# Altium schematic symbol library Minh_Lib.SchLib: 619 symbols (part 4 of 4) (continued)
## STM32F103C8T6_1 (continued)
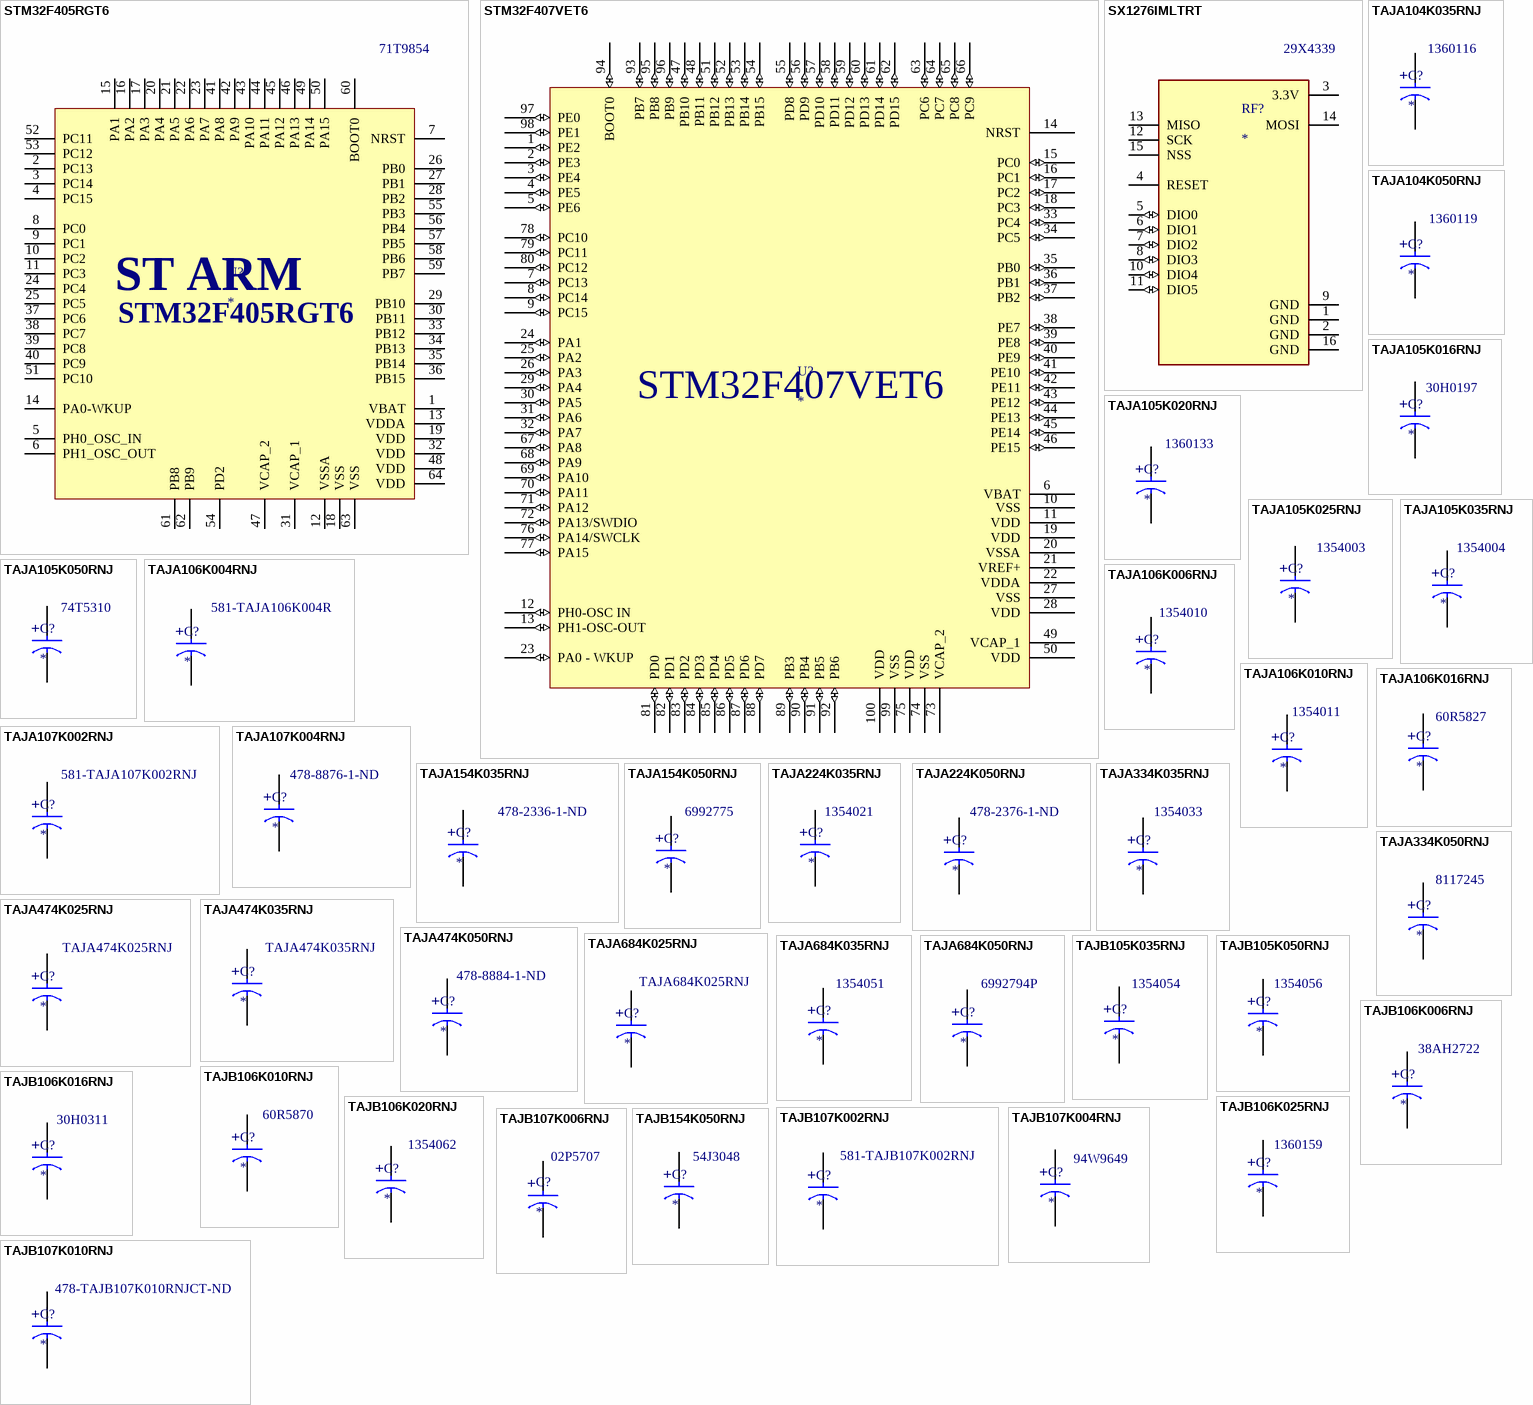
[diagram p14: symbols STM32F405RGT6 to TAJB154K050RNJ]

## STM32F405RGT6
designator U?  Supplier Part Number 1: 71T9854
IC MCU 32BIT 1MB FLASH 64LQFP; Manufacturer: STMicroelectronics; Manufacturer Part Number: STM32F405RGT6; Core Architecture: ARM; Interface: I2C,SPI,USB,CAN,IrDA,UART,USART,LIN,I2S; Data Bus Width: 32b; Frequency: 168MHz; RAM Size: 196KB; Number of I/Os: 51; Max Supply Voltage: 3.6V; Min Supply Voltage: 1.8V; Memory Size: 1024KB; Number of Timers/Counters: 14; Number of ADC Channels: 16; Oscillator Type: Internal; Number of SPI Channels: 3; Peripherals: Brown-out Detect/Reset,POR,PWM,WDT,DMA,LCD,I2C; Number of PWM Channels: 2; Watchdog Timer: Yes; Supplier 1: Newark; RoHS: Yes; Category: Microcontrollers; Pricing 1: 1=16.96000, 10=15.60000, 25=14.94000, 50=14.35000, 100=13.76000, 250=13.17000, 500=11.78000 (USD); Case/Package: LQFP; Number of Pins: 64; Min Operating Temperature: -40°C; Max Operating Temperature: 85°C; Package Quantity: 960; Packaging: Tray; Max Frequency: 168MHz; Number of I2C Channels: 3; Memory Type: FLASH; Number of UART Channels: 2; Series: STM32 F4; Number of Programmable I/O: 51; Length: 10mm; Width: 10mm; Height: 1.45mm; Radiation Hardening: No; Reach SVHC Compliant: Yes; RoHS Compliant: Yes; Lead Free: Lead Free; ComponentLink1URL: https://datasheet.ciiva.com/8055/1717982-8055024.pdf?src-supplier=Element14; ComponentLink1Description: https://datasheet.ciiva.com/8055/1717982-8055024.pdf?src-supplier=Element14; ComponentLink2URL: https://datasheet.ciiva.com/4837/dm00037051-492832-4837997.pdf?src-supplier=Mouser; ComponentLink2Description: https://datasheet.ciiva.com/4837/dm00037051-492832-4837997.pdf?src-supplier=Mouser
footprint LQFP64
pins: 1 VBAT, 2 PC13, 3 PC14, 4 PC15, 5 PH0_OSC_IN, 6 PH1_OSC_OUT, 7 NRST, 8 PC0, 9 PC1, 10 PC2, 11 PC3, 12 VSSA, 13 VDDA, 14 PA0-WKUP, 15 PA1, 16 PA2, 17 PA3, 18 VSS, 19 VDD, 20 PA4, 21 PA5, 22 PA6, 23 PA7, 24 PC4, 25 PC5, 26 PB0, 27 PB1, 28 PB2, 29 PB10, 30 PB11, 31 VCAP_1, 32 VDD, 33 PB12, 34 PB13, 35 PB14, 36 PB15, 37 PC6, 38 PC7, 39 PC8, 40 PC9, 41 PA8, 42 PA9, 43 PA10, 44 PA11, 45 PA12, 46 PA13, 47 VCAP_2, 48 VDD, 49 PA14, 50 PA15, 51 PC10, 52 PC11, 53 PC12, 54 PD2, 55 PB3, 56 PB4, 57 PB5, 58 PB6, 59 PB7, 60 BOOT0, 61 PB8, 62 PB9, 63 VSS, 64 VDD
text: ST ARM

## STM32F407VET6
designator U?
IC MCU 32BIT 512KB FLASH 100LQFP; Manufacturer: STMicroelectronics; Manufacturer Part Number: STM32F407VET6; Frequency: 168MHz; Number of I/Os: 82; Interface: I2C,SPI,USB,CAN,Ethernet,IrDA,UART,USART,LIN,EBI/EMI,I2S; Oscillator Type: Internal; Peripherals: Brown-out Detect/Reset,POR,PWM,WDT,DMA,LCD,I2C; Core Architecture: ARM; RAM Size: 196KB; Number of ADC Channels: 16; Number of Ethernet Channels: 1; Number of Timers/Counters: 14; Number of UART Channels: 2; Max Supply Voltage: 3.6V; Min Supply Voltage: 1.8V; Data Bus Width: 32b; Number of SPI Channels: 3; Watchdog Timer: Yes; Supplier 1: Avnet; RoHS: Yes; Category: Microcontrollers; Pricing 1: 90=9.01321, 100=8.83112, 190=8.64904, 450=8.46695, 900=8.28487, 4500=8.10278, 9000=7.92070 (USD); Case/Package: LQFP; Number of Pins: 100; Min Operating Temperature: -40°C; Max Operating Temperature: 85°C; Packaging: Tray; Memory Type: FLASH; Memory Size: 512KB; Package Quantity: 90; Number of Programmable I/O: 82; Max Frequency: 168MHz; Number of I2C Channels: 3; Series: STM32 F4; Number of PWM Channels: 2; Length: 14.2mm; Width: 14.2mm; Height: 1.45mm; Radiation Hardening: No; RoHS Compliant: Yes; Reach SVHC Compliant: Yes; Lead Free: Lead Free; ComponentLink1URL: https://datasheet.ciiva.com/16330/dm00037051-16330920.pdf?src-supplier=Future+Electronics; ComponentLink1Description: https://datasheet.ciiva.com/16330/dm00037051-16330920.pdf?src-supplier=Future+Electronics; ComponentLink2URL: https://datasheet.ciiva.com/8055/1717982-8055038.pdf?src-supplier=Element14; ComponentLink2Description: https://datasheet.ciiva.com/8055/1717982-8055038.pdf?src-supplier=Element14; ComponentLink3URL: https://datasheet.ciiva.com/4837/dm00037051-492832-4837637.pdf?src-supplier=Mouser; ComponentLink3Description: https://datasheet.ciiva.com/4837/dm00037051-492832-4837637.pdf?src-supplier=Mouser; Supplier Part Number 1: STM32F407VET6
footprint LQFP100
pins: 1 PE2 (io), 2 PE3 (io), 3 PE4 (io), 4 PE5 (io), 5 PE6 (io), 6 VBAT (power), 7 PC13 (io), 8 PC14 (io), 9 PC15 (io), 10 VSS (power), 11 VDD (power), 12 PH0-OSC IN (io), 13 PH1-OSC-OUT (io), 14 NRST, 15 PC0 (io), 16 PC1 (io), 17 PC2 (io), 18 PC3 (io), 19 VDD (power), 20 VSSA (power), 21 VREF+ (power), 22 VDDA (power), 23 PA0 - WKUP (io), 24 PA1 (io), 25 PA2 (io), 26 PA3 (io), 27 VSS (power), 28 VDD (power), 29 PA4 (io), 30 PA5 (io), 31 PA6 (io), 32 PA7 (io), 33 PC4 (io), 34 PC5 (io), 35 PB0 (io), 36 PB1 (io), 37 PB2 (io), 38 PE7 (io), 39 PE8 (io), 40 PE9 (io), 41 PE10 (io), 42 PE11 (io), 43 PE12 (io), 44 PE13 (io), 45 PE14 (io), 46 PE15 (io), 47 PB10 (io), 48 PB11 (io), 49 VCAP_1 (power), 50 VDD (power), 51 PB12 (io), 52 PB13 (io), 53 PB14 (io), 54 PB15 (io), 55 PD8 (io), 56 PD9 (io), 57 PD10 (io), 58 PD11 (io), 59 PD12 (io), 60 PD13 (io), 61 PD14 (io), 62 PD15 (io), 63 PC6 (io), 64 PC7 (io), 65 PC8 (io), 66 PC9 (io), 67 PA8 (io), 68 PA9 (io), 69 PA10 (io), 70 PA11 (io), 71 PA12 (io), 72 PA13/SWDIO (io), 73 VCAP_2 (power), 74 VSS (power), 75 VDD (power), 76 PA14/SWCLK (io), 77 PA15 (io), 78 PC10 (io), 79 PC11 (io), 80 PC12 (io), 81 PD0 (io), 82 PD1 (io), 83 PD2 (io), 84 PD3 (io), 85 PD4 (io), 86 PD5 (io), 87 PD6 (io), 88 PD7 (io), 89 PB3 (io), 90 PB4 (io), 91 PB5 (io), 92 PB6 (io), 93 PB7 (io), 94 BOOT0 (io), 95 PB8 (io), 96 PB9 (io), 97 PE0 (io), 98 PE1 (io), 99 VSS (power), 100 VDD (power)

## SX1276IMLTRT
designator RF?  Supplier Part Number 1: 29X4339
Rf Ism Transceiver Fsk/gfsk/gmsk/msk/ook 3.3V Automotive 28-PIN QFN Ep T/r; Manufacturer: Semtech; Manufacturer Part Number: SX1276IMLTRT; Frequency: 137MHz; Data Rate: 300Kbps; Sensitivity: -148dBm; Number of GPIO: 6; Interface: SPI; Current - Receiving: 12mA; Current - Transmitting: 120mA; Operating Supply Voltage: 3.7V; Supplier 1: Newark; RoHS: Yes; Category: RF Receivers, Transceivers; Stock 1: 2848; Pricing 1: 1=9.90000, 10=9.04000, 25=8.28000, 50=7.88000, 100=7.47000, 250=6.87000, 500=6.24000 (USD); Case/Package: VQFN; Min Operating Temperature: -40°C; Max Operating Temperature: 85°C; Packaging: Tape and Reel; Package Quantity: 3000; Lead Free: Lead Free; RoHS Compliant: Yes; ComponentLink1URL: https://datasheet.ciiva.com/29635/sx1276-29635606.pdf?src-supplier=Digi-Key; ComponentLink1Description: https://datasheet.ciiva.com/29635/sx1276-29635606.pdf?src-supplier=Digi-Key; ComponentLink2URL: https://datasheet.ciiva.com/29635/sx1276-29635607.pdf?src-supplier=Digi-Key; ComponentLink2Description: https://datasheet.ciiva.com/29635/sx1276-29635607.pdf?src-supplier=Digi-Key; ComponentLink3URL: https://datasheet.ciiva.com/29635/sx1276-29635605.pdf?src-supplier=Digi-Key; ComponentLink3Description: https://datasheet.ciiva.com/29635/sx1276-29635605.pdf?src-supplier=Digi-Key
footprint Lora SX1278 433MHz  / Ai-Thinker Ra-02 (415MHZ)
pins: 1 GND (power), 2 GND (power), 3 3.3V (power), 4 RESET, 5 DIO0 (io), 6 DIO1 (io), 7 DIO2 (io), 8 DIO3 (io), 9 GND, 10 DIO4 (io), 11 DIO5 (io), 12 SCK, 13 MISO, 14 MOSI, 15 NSS, 16 GND (power)

## TAJA104K035RNJ
designator C?  Supplier Part Number 1: 1360116
钽电容 0.1uF ±10% 35V 24Ω A型3216; Manufacturer: Kyocera AVX; Manufacturer Part Number: TAJA104K035RNJ; Dielectric Material: Tantalum; Capacitance: 100nF; ESR (Equivalent Series Resistance): 24R; Leakage Current: 500nA; Polarity: Polar; Dissipation Factor: 4%; Q Factor: 4; Supplier 1: RSComponents; RoHS: Yes; Category: Tantalum Capacitors; Stock 1: 1; Pricing 1: 50=0.40200, 250=0.26900, 1000=0.16100, 2500=0.13400 (USD); Mount: Surface Mount,PCB; Case/Package: 1206; Number of Pins: 2; Case Code (Imperial): 1206; Case Code (Metric): 3216; Min Operating Temperature: -55°C; Max Operating Temperature: 125°C; Tolerance: 10%; Voltage Rating: 35V; Voltage Rating (DC): 35V; Package Quantity: 1; Packaging: Tape and Reel; Termination: SMD/SMT; Voltage: 35V; Features: General Purpose; Series: TAJ; Construction: Flat; Length: 3.2mm; Width: 1.6mm; Height: 1.6mm; Height - Seated (Max): 0.071inch; Depth: 1.6mm; Lead Pitch: 1.1mm; Radiation Hardening: No; RoHS Compliant: Yes; REACH SVHC: No SVHC; Lead Free: Lead Free; ComponentLink1URL: https://datasheet.ciiva.com/26929/getdatasheetpartid-71413-26929277.pdf?src-supplier=Verical; ComponentLink1Description: https://datasheet.ciiva.com/26929/getdatasheetpartid-71413-26929277.pdf?src-supplier=Verical; ComponentLink2URL: https://datasheet.ciiva.com/18710/taj-eng-18710620.pdf?src-supplier=Distrelec; ComponentLink2Description: https://datasheet.ciiva.com/18710/taj-eng-18710620.pdf?src-supplier=Distrelec; ComponentLink3URL: https://datasheet.ciiva.com/263/taj-263924.pdf?src-supplier=Digi-Key; ComponentLink3Description: https://datasheet.ciiva.com/263/taj-263924.pdf?src-supplier=Digi-Key; ComponentLink4URL: https://datasheet.ciiva.com/263/taj-263923.pdf?src-supplier=Digi-Key; ComponentLink4Description: https://datasheet.ciiva.com/263/taj-263923.pdf?src-supplier=Digi-Key; ComponentLink5URL: https://datasheet.ciiva.com/263/taj-263925.pdf?src-supplier=Digi-Key; ComponentLink5Description: https://datasheet.ciiva.com/263/taj-263925.pdf?src-supplier=Digi-Key; ComponentLink6URL: https://datasheet.ciiva.com/14590/70001050-14590597.pdf?src-supplier=Allied+Electronics; ComponentLink6Description: https://datasheet.ciiva.com/14590/70001050-14590597.pdf?src-supplier=Allied+Electronics; ComponentLink7URL: https://datasheet.ciiva.com/14593/70001050-14593609.pdf?src-supplier=Allied+Electronics; ComponentLink7Description: https://datasheet.ciiva.com/14593/70001050-14593609.pdf?src-supplier=Allied+Electronics; ComponentLink8URL: https://datasheet.ciiva.com/11216/taj-11216814.pdf?src-supplier=Avnet; ComponentLink8Description: https://datasheet.ciiva.com/11216/taj-11216814.pdf?src-supplier=Avnet; ComponentLink9URL: https://datasheet.ciiva.com/16297/taj-16297467.pdf?src-supplier=Future+Electronics; ComponentLink9Description: https://datasheet.ciiva.com/16297/taj-16297467.pdf?src-supplier=Future+Electronics; ComponentLink10URL: https://datasheet.ciiva.com/16486/taj-16486069.pdf?src-supplier=Avnet+Asia; ComponentLink10Description: https://datasheet.ciiva.com/16486/taj-16486069.pdf?src-supplier=Avnet+Asia; ComponentLink11URL: https://datasheet.ciiva.com/3004/taj-3004370.pdf?src-supplier=Avnet; ComponentLink11Description: https://datasheet.ciiva.com/3004/taj-3004370.pdf?src-supplier=Avnet
footprint Capacitor/Tantalum  - SMD3216/A - AVX (1206/3216-18 SIZE A-AVX)
pins: 1, 2
text: +

## TAJA104K050RNJ
designator C?  Supplier Part Number 1: 1360119
钽电容 0.1uF ±10% 50V 22Ω A型3216; Manufacturer: Kyocera AVX; Manufacturer Part Number: TAJA104K050RNJ; Dielectric Material: Tantalum; Capacitance: 100nF; ESR (Equivalent Series Resistance): 22R; Leakage Current: 500nA; Polarity: Polar; Dissipation Factor: 4%; Supplier 1: RSComponents; RoHS: Yes; Category: Tantalum Capacitors; Stock 1: 1; Pricing 1: 20=0.55300, 60=0.46900, 100=0.41400, 260=0.35900, 1000=0.33200 (USD); Mount: Surface Mount,PCB; Case/Package: 1206; Number of Pins: 2; Case Code (Metric): 3216; Case Code (Imperial): 1206; Weight: 0.000571oz; Min Operating Temperature: -55°C; Max Operating Temperature: 125°C; Tolerance: 10%; Package Quantity: 1; Voltage Rating: 50V; Packaging: Tape and Reel; Voltage Rating (DC): 50V; Termination: SMD/SMT; Voltage: 50V; Features: General Purpose; Series: TAJ; Construction: Flat; Length: 3.2mm; Width: 1.6mm; Height: 1.6mm; Height - Seated (Max): 0.071inch; Depth: 1.6mm; Lead Pitch: 1.1mm; Radiation Hardening: No; REACH SVHC: No SVHC; Lead Free: Lead Free; RoHS Compliant: Yes; ComponentLink1URL: https://datasheet.ciiva.com/7853/1680476-7853077.pdf?src-supplier=Element14; ComponentLink1Description: https://datasheet.ciiva.com/7853/1680476-7853077.pdf?src-supplier=Element14; ComponentLink2URL: https://datasheet.ciiva.com/263/taj-263730.pdf?src-supplier=Digi-Key; ComponentLink2Description: https://datasheet.ciiva.com/263/taj-263730.pdf?src-supplier=Digi-Key; ComponentLink3URL: https://datasheet.ciiva.com/263/taj-263729.pdf?src-supplier=Digi-Key; ComponentLink3Description: https://datasheet.ciiva.com/263/taj-263729.pdf?src-supplier=Digi-Key; ComponentLink4URL: https://datasheet.ciiva.com/263/taj-263731.pdf?src-supplier=Digi-Key; ComponentLink4Description: https://datasheet.ciiva.com/263/taj-263731.pdf?src-supplier=Digi-Key; ComponentLink5URL: https://datasheet.ciiva.com/12910/taj-27497-12910895.pdf?src-supplier=Mouser; ComponentLink5Description: https://datasheet.ciiva.com/12910/taj-27497-12910895.pdf?src-supplier=Mouser; ComponentLink6URL: https://datasheet.ciiva.com/14592/70001050-14592121.pdf?src-supplier=Allied+Electronics; ComponentLink6Description: https://datasheet.ciiva.com/14592/70001050-14592121.pdf?src-supplier=Allied+Electronics; ComponentLink7URL: https://datasheet.ciiva.com/14595/70001050-14595389.pdf?src-supplier=Allied+Electronics; ComponentLink7Description: https://datasheet.ciiva.com/14595/70001050-14595389.pdf?src-supplier=Allied+Electronics; ComponentLink8URL: https://datasheet.ciiva.com/11216/taj-11216839.pdf?src-supplier=Avnet; ComponentLink8Description: https://datasheet.ciiva.com/11216/taj-11216839.pdf?src-supplier=Avnet; ComponentLink9URL: https://datasheet.ciiva.com/16289/taj-16289723.pdf?src-supplier=Future+Electronics; ComponentLink9Description: https://datasheet.ciiva.com/16289/taj-16289723.pdf?src-supplier=Future+Electronics; ComponentLink10URL: https://datasheet.ciiva.com/15163/getdatasheetpartid-62923-15163130.pdf?src-supplier=Verical; ComponentLink10Description: https://datasheet.ciiva.com/15163/getdatasheetpartid-62923-15163130.pdf?src-supplier=Verical
footprint Capacitor/Tantalum  - SMD3216/A - AVX (1206/3216-18 SIZE A-AVX)
pins: 1, 2
text: +

## TAJA105K016RNJ
designator C?  Supplier Part Number 1: 30H0197
钽电容 1uF ±10% 16V 11Ω A型3216; Manufacturer: Kyocera AVX; Manufacturer Part Number: TAJA105K016RNJ; Dielectric Material: Tantalum; Tolerance: 20%; ESR (Equivalent Series Resistance): 11R; Polarity: Polar; Leakage Current: 500nA; Dissipation Factor: 4%; Supplier 1: Newark; RoHS: Yes; Category: Tantalum Capacitors; Mount: Surface Mount,PCB; Case/Package: 1206; Number of Pins: 2; Case Code (Metric): 3216; Case Code (Imperial): 1206; Weight: 0.000571oz; Min Operating Temperature: -55°C; Max Operating Temperature: 125°C; Capacitance: 1uF; Voltage Rating (DC): 16V; Packaging: Tape and Reel; Package Quantity: 1; Voltage Rating: 16V; Termination: SMD/SMT; Voltage: 16V; Features: General Purpose; Series: TAJ; Length: 3.2mm; Width: 1.6mm; Height: 1.6mm; Height - Seated (Max): 0.071inch; Depth: 1.6mm; Lead Pitch: 1.1mm; Radiation Hardening: No; REACH SVHC: No SVHC; Lead Free: Lead Free; RoHS Compliant: Yes; ComponentLink1URL: https://datasheet.ciiva.com/18710/taj-eng-18710647.pdf?src-supplier=Distrelec; ComponentLink1Description: https://datasheet.ciiva.com/18710/taj-eng-18710647.pdf?src-supplier=Distrelec; ComponentLink2URL: https://datasheet.ciiva.com/7832/taj-7832811.pdf?src-supplier=Element14; ComponentLink2Description: https://datasheet.ciiva.com/7832/taj-7832811.pdf?src-supplier=Element14; ComponentLink3URL: https://datasheet.ciiva.com/7832/taj-7832810.pdf?src-supplier=Element14; ComponentLink3Description: https://datasheet.ciiva.com/7832/taj-7832810.pdf?src-supplier=Element14; ComponentLink4URL: https://datasheet.ciiva.com/7832/1680476-7832431.pdf?src-supplier=Element14; ComponentLink4Description: https://datasheet.ciiva.com/7832/1680476-7832431.pdf?src-supplier=Element14; ComponentLink5URL: https://datasheet.ciiva.com/263/taj-263410.pdf?src-supplier=Digi-Key; ComponentLink5Description: https://datasheet.ciiva.com/263/taj-263410.pdf?src-supplier=Digi-Key; ComponentLink6URL: https://datasheet.ciiva.com/263/taj-263409.pdf?src-supplier=Digi-Key; ComponentLink6Description: https://datasheet.ciiva.com/263/taj-263409.pdf?src-supplier=Digi-Key; ComponentLink7URL: https://datasheet.ciiva.com/263/taj-263411.pdf?src-supplier=Digi-Key; ComponentLink7Description: https://datasheet.ciiva.com/263/taj-263411.pdf?src-supplier=Digi-Key; ComponentLink8URL: https://datasheet.ciiva.com/7832/1703059-7832429.pdf?src-supplier=Element14; ComponentLink8Description: https://datasheet.ciiva.com/7832/1703059-7832429.pdf?src-supplier=Element14; ComponentLink9URL: https://datasheet.ciiva.com/7832/1703059-7832430.pdf?src-supplier=Element14; ComponentLink9Description: https://datasheet.ciiva.com/7832/1703059-7832430.pdf?src-supplier=Element14
footprint Capacitor/Tantalum  - SMD3216/A - AVX (1206/3216-18 SIZE A-AVX)
pins: 1, 2
text: +

## TAJA105K020RNJ
designator C?  Supplier Part Number 1: 1360133
钽电容 1uF ±10% 20V 9Ω A型3216; Manufacturer: Kyocera AVX; Manufacturer Part Number: TAJA105K020RNJ; Dielectric Material: Tantalum; Tolerance: 20%; ESR (Equivalent Series Resistance): 9R; Leakage Current: 500nA; Polarity: Polar; Dissipation Factor: 4%; Supplier 1: RSComponents; RoHS: Yes; Category: Tantalum Capacitors; Stock 1: 1; Pricing 1: 20=0.29000, 100=0.28000, 200=0.26600, 500=0.24200, 1000=0.21500 (USD); Mount: Surface Mount,PCB; Case/Package: 1206; Number of Pins: 2; Case Code (Imperial): 1206; Case Code (Metric): 3216; Min Operating Temperature: -55°C; Max Operating Temperature: 125°C; Capacitance: 1uF; Voltage Rating: 20V; Voltage Rating (DC): 20V; Package Quantity: 1; Packaging: Tape and Reel; Termination: SMD/SMT; Voltage: 20V; Features: General Purpose; Series: TAJ; Construction: Flat; Length: 3.2mm; Width: 1.6mm; Height: 1.6mm; Height - Seated (Max): 0.071inch; Depth: 1.6mm; Radiation Hardening: No; REACH SVHC: No SVHC; Lead Free: Lead Free; RoHS Compliant: Yes; ComponentLink1URL: https://datasheet.ciiva.com/11794/0900766b80ccdc61-11794382.pdf?src-supplier=RSComponents; ComponentLink1Description: https://datasheet.ciiva.com/11794/0900766b80ccdc61-11794382.pdf?src-supplier=RSComponents; ComponentLink2URL: https://datasheet.ciiva.com/12883/taj-27497-12883280.pdf?src-supplier=Mouser; ComponentLink2Description: https://datasheet.ciiva.com/12883/taj-27497-12883280.pdf?src-supplier=Mouser; ComponentLink3URL: https://datasheet.ciiva.com/263/taj-263413.pdf?src-supplier=Digi-Key; ComponentLink3Description: https://datasheet.ciiva.com/263/taj-263413.pdf?src-supplier=Digi-Key; ComponentLink4URL: https://datasheet.ciiva.com/263/taj-263412.pdf?src-supplier=Digi-Key; ComponentLink4Description: https://datasheet.ciiva.com/263/taj-263412.pdf?src-supplier=Digi-Key; ComponentLink5URL: https://datasheet.ciiva.com/263/taj-263414.pdf?src-supplier=Digi-Key; ComponentLink5Description: https://datasheet.ciiva.com/263/taj-263414.pdf?src-supplier=Digi-Key; ComponentLink6URL: https://datasheet.ciiva.com/14608/70001050-14608053.pdf?src-supplier=Allied+Electronics; ComponentLink6Description: https://datasheet.ciiva.com/14608/70001050-14608053.pdf?src-supplier=Allied+Electronics; ComponentLink7URL: https://datasheet.ciiva.com/14598/70001050-14598921.pdf?src-supplier=Allied+Electronics; ComponentLink7Description: https://datasheet.ciiva.com/14598/70001050-14598921.pdf?src-supplier=Allied+Electronics; ComponentLink8URL: https://datasheet.ciiva.com/3004/taj-3004373.pdf?src-supplier=Avnet; ComponentLink8Description: https://datasheet.ciiva.com/3004/taj-3004373.pdf?src-supplier=Avnet; ComponentLink9URL: https://datasheet.ciiva.com/16203/taj-16203563.pdf?src-supplier=Future+Electronics; ComponentLink9Description: https://datasheet.ciiva.com/16203/taj-16203563.pdf?src-supplier=Future+Electronics; ComponentLink10URL: https://datasheet.ciiva.com/16486/taj-16486073.pdf?src-supplier=Avnet+Asia; ComponentLink10Description: https://datasheet.ciiva.com/16486/taj-16486073.pdf?src-supplier=Avnet+Asia; ComponentLink11URL: https://datasheet.ciiva.com/3004/taj-3004372.pdf?src-supplier=Avnet; ComponentLink11Description: https://datasheet.ciiva.com/3004/taj-3004372.pdf?src-supplier=Avnet
footprint Capacitor/Tantalum  - SMD3216/A - AVX (1206/3216-18 SIZE A-AVX)
pins: 1, 2
text: +

## TAJA105K025RNJ
designator C?  Supplier Part Number 1: 1354003
钽电容 1uF ±10% 25V 8Ω A型3216; Manufacturer: Kyocera AVX; Manufacturer Part Number: TAJA105K025RNJ; Dielectric Material: Tantalum; Tolerance: 20%; ESR (Equivalent Series Resistance): 8R; Leakage Current: 500nA; Dissipation Factor: 4%; Polarity: Polar; Dielectric: X7R; Supplier 1: RSComponents; RoHS: Yes; Category: Tantalum Capacitors; Stock 1: 9030; Pricing 1: 2000=0.13300, 6000=0.12000 (USD); Mount: Surface Mount,PCB; Case/Package: 1206; Number of Pins: 2; Case Code (Metric): 3216; Case Code (Imperial): 1206; Weight: 0.000571oz; Min Operating Temperature: -55°C; Max Operating Temperature: 125°C; Capacitance: 1uF; Package Quantity: 1; Voltage Rating: 25V; Packaging: Tape and Reel; Voltage Rating (DC): 25V; Termination: SMD/SMT; Voltage: 25V; Features: General Purpose; Series: TAJ; Construction: Flat; Length: 3.2mm; Width: 1.6mm; Height: 1.6mm; Height - Seated (Max): 0.071inch; Depth: 1.6mm; Radiation Hardening: No; REACH SVHC: No SVHC; Lead Free: Lead Free; RoHS Compliant: Yes; ComponentLink1URL: https://datasheet.ciiva.com/11793/0900766b80ccdc61-11793068.pdf?src-supplier=RSComponents; ComponentLink1Description: https://datasheet.ciiva.com/11793/0900766b80ccdc61-11793068.pdf?src-supplier=RSComponents; ComponentLink2URL: https://datasheet.ciiva.com/26341/559407-da-01-en-tacc-a-3-2-mm-x-1-6-mm-x-1-6-mm-1-0-uf-26341752.pdf?src-supplier=Conrad; ComponentLink2Description: https://datasheet.ciiva.com/26341/559407-da-01-en-tacc-a-3-2-mm-x-1-6-mm-x-1-6-mm-1-0-uf-26341752.pdf?src-supplier=Conrad; ComponentLink3URL: https://datasheet.ciiva.com/7832/1680476-7832437.pdf?src-supplier=Element14; ComponentLink3Description: https://datasheet.ciiva.com/7832/1680476-7832437.pdf?src-supplier=Element14; ComponentLink4URL: https://datasheet.ciiva.com/263/taj-263440.pdf?src-supplier=Digi-Key; ComponentLink4Description: https://datasheet.ciiva.com/263/taj-263440.pdf?src-supplier=Digi-Key; ComponentLink5URL: https://datasheet.ciiva.com/263/taj-263439.pdf?src-supplier=Digi-Key; ComponentLink5Description: https://datasheet.ciiva.com/263/taj-263439.pdf?src-supplier=Digi-Key; ComponentLink6URL: https://datasheet.ciiva.com/263/taj-263441.pdf?src-supplier=Digi-Key; ComponentLink6Description: https://datasheet.ciiva.com/263/taj-263441.pdf?src-supplier=Digi-Key; ComponentLink7URL: https://datasheet.ciiva.com/12911/taj-27497-12911454.pdf?src-supplier=Mouser; ComponentLink7Description: https://datasheet.ciiva.com/12911/taj-27497-12911454.pdf?src-supplier=Mouser; ComponentLink8URL: https://datasheet.ciiva.com/3004/taj-3004374.pdf?src-supplier=Avnet; ComponentLink8Description: https://datasheet.ciiva.com/3004/taj-3004374.pdf?src-supplier=Avnet; ComponentLink9URL: https://datasheet.ciiva.com/16380/taj-16380127.pdf?src-supplier=Future+Electronics; ComponentLink9Description: https://datasheet.ciiva.com/16380/taj-16380127.pdf?src-supplier=Future+Electronics; ComponentLink10URL: https://datasheet.ciiva.com/15163/getdatasheetpartid-91077-15163275.pdf?src-supplier=Verical; ComponentLink10Description: https://datasheet.ciiva.com/15163/getdatasheetpartid-91077-15163275.pdf?src-supplier=Verical; ComponentLink11URL: https://datasheet.ciiva.com/3004/taj-3004375.pdf?src-supplier=Avnet; ComponentLink11Description: https://datasheet.ciiva.com/3004/taj-3004375.pdf?src-supplier=Avnet
footprint Capacitor/Tantalum  - SMD3216/A - AVX (1206/3216-18 SIZE A-AVX)
pins: 1, 2
text: +

## TAJA105K035RNJ
designator C?  Supplier Part Number 1: 1354004
钽电容 1uF ±10% 35V 7.5Ω A型3216; Manufacturer: Kyocera AVX; Manufacturer Part Number: TAJA105K035RNJ; Dielectric Material: Tantalum; Tolerance: 20%; ESR (Equivalent Series Resistance): 7.5R; Leakage Current: 500nA; Polarity: Polar; Dissipation Factor: 4%; Voltage: 25V; Q Factor: 4; Supplier 1: RSComponents; RoHS: Yes; Category: Tantalum Capacitors; Stock 1: 2000; Pricing 1: 2000=0.13200, 4000=0.12600, 6000=0.12100 (USD); Mount: Surface Mount,PCB; Case/Package: 1206; Number of Pins: 2; Case Code (Imperial): 1206; Case Code (Metric): 3216; Weight: 0.000571oz; Min Operating Temperature: -55°C; Max Operating Temperature: 125°C; Capacitance: 1uF; Package Quantity: 1; Voltage Rating: 35V; Packaging: Tape and Reel; Voltage Rating (DC): 35V; Termination: SMD/SMT; Features: General Purpose; Series: TAJ; Construction: Flat; Length: 3.2mm; Width: 1.6mm; Height: 1.6mm; Height - Seated (Max): 0.071inch; Depth: 1.6mm; Radiation Hardening: No; REACH SVHC: No SVHC; Lead Free: Lead Free; RoHS Compliant: Yes; ComponentLink1URL: https://datasheet.ciiva.com/11794/0900766b802e69d0-11794381.pdf?src-supplier=RSComponents; ComponentLink1Description: https://datasheet.ciiva.com/11794/0900766b802e69d0-11794381.pdf?src-supplier=RSComponents; ComponentLink2URL: https://datasheet.ciiva.com/26341/559408-da-01-en-tacc-a-3-2-mm-x-1-6-mm-x-1-6-mm-1-0-uf-26341750.pdf?src-supplier=Conrad; ComponentLink2Description: https://datasheet.ciiva.com/26341/559408-da-01-en-tacc-a-3-2-mm-x-1-6-mm-x-1-6-mm-1-0-uf-26341750.pdf?src-supplier=Conrad; ComponentLink3URL: https://datasheet.ciiva.com/15163/getdatasheetpartid-110557-15163365.pdf?src-supplier=Verical; ComponentLink3Description: https://datasheet.ciiva.com/15163/getdatasheetpartid-110557-15163365.pdf?src-supplier=Verical; ComponentLink4URL: https://datasheet.ciiva.com/16338/taj-16338780.pdf?src-supplier=Future+Electronics; ComponentLink4Description: https://datasheet.ciiva.com/16338/taj-16338780.pdf?src-supplier=Future+Electronics; ComponentLink5URL: https://datasheet.ciiva.com/3004/taj-3004376.pdf?src-supplier=Avnet; ComponentLink5Description: https://datasheet.ciiva.com/3004/taj-3004376.pdf?src-supplier=Avnet; ComponentLink6URL: https://datasheet.ciiva.com/14605/70001050-14605278.pdf?src-supplier=Allied+Electronics; ComponentLink6Description: https://datasheet.ciiva.com/14605/70001050-14605278.pdf?src-supplier=Allied+Electronics; ComponentLink7URL: https://datasheet.ciiva.com/14603/70001050-14603833.pdf?src-supplier=Allied+Electronics; ComponentLink7Description: https://datasheet.ciiva.com/14603/70001050-14603833.pdf?src-supplier=Allied+Electronics; ComponentLink8URL: https://datasheet.ciiva.com/12911/taj-27497-12911077.pdf?src-supplier=Mouser; ComponentLink8Description: https://datasheet.ciiva.com/12911/taj-27497-12911077.pdf?src-supplier=Mouser; ComponentLink9URL: https://datasheet.ciiva.com/18710/taj-eng-18710621.pdf?src-supplier=Distrelec; ComponentLink9Description: https://datasheet.ciiva.com/18710/taj-eng-18710621.pdf?src-supplier=Distrelec; ComponentLink10URL: https://datasheet.ciiva.com/263/taj-263480.pdf?src-supplier=Digi-Key; ComponentLink10Description: https://datasheet.ciiva.com/263/taj-263480.pdf?src-supplier=Digi-Key; ComponentLink11URL: https://datasheet.ciiva.com/263/taj-263478.pdf?src-supplier=Digi-Key; ComponentLink11Description: https://datasheet.ciiva.com/263/taj-263478.pdf?src-supplier=Digi-Key; ComponentLink12URL: https://datasheet.ciiva.com/263/taj-263479.pdf?src-supplier=Digi-Key; ComponentLink12Description: https://datasheet.ciiva.com/263/taj-263479.pdf?src-supplier=Digi-Key; ComponentLink13URL: https://datasheet.ciiva.com/7832/1680476-7832438.pdf?src-supplier=Element14; ComponentLink13Description: https://datasheet.ciiva.com/7832/1680476-7832438.pdf?src-supplier=Element14; ComponentLink14URL: https://datasheet.ciiva.com/7832/49917-7832439.pdf?src-supplier=Element14; ComponentLink14Description: https://datasheet.ciiva.com/7832/49917-7832439.pdf?src-supplier=Element14; ComponentLink15URL: https://datasheet.ciiva.com/7832/49917-7832440.pdf?src-supplier=Element14; ComponentLink15Description: https://datasheet.ciiva.com/7832/49917-7832440.pdf?src-supplier=Element14; ComponentLink16URL: https://datasheet.ciiva.com/16486/taj-16486078.pdf?src-supplier=Avnet+Asia; ComponentLink16Description: https://datasheet.ciiva.com/16486/taj-16486078.pdf?src-supplier=Avnet+Asia; ComponentLink17URL: https://datasheet.ciiva.com/3004/taj-3004377.pdf?src-supplier=Avnet; ComponentLink17Description: https://datasheet.ciiva.com/3004/taj-3004377.pdf?src-supplier=Avnet
footprint Capacitor/Tantalum  - SMD3216/A - AVX (1206/3216-18 SIZE A-AVX)
pins: 1, 2
text: +

## TAJA105K050RNJ
designator C?  Supplier Part Number 1: 74T5310
钽电容 1uF ±10% 50V 6.6Ω A型3216; Manufacturer: Kyocera AVX; Manufacturer Part Number: TAJA105K050RNJ; ESR (Equivalent Series Resistance): 6.6R; Polarity: Polar; Dissipation Factor: 4%; Supplier 1: Newark; RoHS: Yes; Category: Tantalum Capacitors; Pricing 1: 1=0.54800, 2000=0.54700, 4000=0.54500 (USD); Mount: Surface Mount; Case/Package: 1206; Case Code (Metric): 3216; Case Code (Imperial): 1206; Min Operating Temperature: -55°C; Max Operating Temperature: 125°C; Capacitance: 1uF; Tolerance: 10%; Package Quantity: 2000; Voltage Rating: 50V; Packaging: Tape and Reel; Termination: SMD/SMT; Voltage Rating (DC): 50V; Features: General Purpose; Series: TAJ; Construction: Flat; Length: 3.2mm; Width: 0.063inch; Height: 1.8mm; Height - Seated (Max): 0.071inch; Depth: 1.6mm; Radiation Hardening: No; Lead Free: Lead Free; RoHS Compliant: Yes; ComponentLink1URL: https://datasheet.ciiva.com/11219/taj-11219599.pdf?src-supplier=Avnet; ComponentLink1Description: https://datasheet.ciiva.com/11219/taj-11219599.pdf?src-supplier=Avnet; ComponentLink2URL: https://datasheet.ciiva.com/17337/taj-17337532.pdf?src-supplier=Avnet+Europe; ComponentLink2Description: https://datasheet.ciiva.com/17337/taj-17337532.pdf?src-supplier=Avnet+Europe
footprint Capacitor/Tantalum  - SMD3216/A - AVX (1206/3216-18 SIZE A-AVX)
pins: 1, 2
text: +

## TAJA106K004RNJ
designator C?  Supplier Part Number 1: 581-TAJA106K004R
Cap Tant Solid 10uF 4V A CASE 10% (3.2 X 1.6 X 1.6mm) SMD 3216-18 6 Ohm 125°C T/R; Manufacturer: Kyocera AVX; Manufacturer Part Number: TAJA106K004RNJ; Dielectric Material: Tantalum; ESR (Equivalent Series Resistance): 6R; Polarity: Polar; Dissipation Factor: 6%; Supplier 1: Mouser; RoHS: Yes; Category: Tantalum Capacitors; Stock 1: 1607; Pricing 1: 1=0.85000, 10=0.64300, 50=0.64300, 100=0.46000, 1000=0.30700, 10000=0.25100 (USD); Case/Package: Molded; Number of Pins: 2; Case Code (Imperial): 1206; Case Code (Metric): 3216; Min Operating Temperature: -55°C; Max Operating Temperature: 125°C; Capacitance: 10uF; Tolerance: 10%; Packaging: Tape and Reel; Package Quantity: 2000; Voltage Rating: 4V; Termination: SMD/SMT; Voltage Rating (DC): 4V; Series: TAJ; Construction: Flat; Length: 3.2mm; Width: 1.6mm; Height: 1.8mm; Depth: 1.6mm; Radiation Hardening: No; Lead Free: Lead Free; RoHS Compliant: Yes; ComponentLink1URL: http://components.arrow.com/part/dataview/0323_01307636?src-supplier=Arrow+Europe; ComponentLink1Description: http://components.arrow.com/part/dataview/0323_01307636?src-supplier=Arrow+Europe; ComponentLink2URL: http://www.mouser.com/ds/2/40/taj-776811.pdf?src-supplier=Mouser; ComponentLink2Description: http://www.mouser.com/ds/2/40/taj-776811.pdf?src-supplier=Mouser
footprint Capacitor/Tantalum  - SMD3216/A - AVX (1206/3216-18 SIZE A-AVX)
pins: 1, 2
text: +

## TAJA106K006RNJ
designator C?  Supplier Part Number 1: 1354010
钽电容 10uF ±10% 6.3V 4Ω A型3216; Manufacturer: Kyocera AVX; Manufacturer Part Number: TAJA106K006RNJ; Dielectric Material: Tantalum; Tolerance: 20%; ESR (Equivalent Series Resistance): 4R; Leakage Current: 600nA; Polarity: Polar; Dissipation Factor: 6%; Q Factor: 6; Supplier 1: RSComponents; RoHS: Yes; Category: Tantalum Capacitors; Stock 1: 44000; Pricing 1: 2000=0.11200, 4000=0.10600, 6000=0.10200 (USD); Mount: Surface Mount,PCB; Case/Package: 1206; Case Code (Imperial): 1206; Case Code (Metric): 3216; Min Operating Temperature: -55°C; Max Operating Temperature: 125°C; Capacitance: 10uF; Packaging: Tape and Reel; Voltage Rating: 6.3V; Voltage Rating (DC): 6.3V; Package Quantity: 1; Termination: SMD/SMT; Voltage: 6.3V; Features: General Purpose; Series: TAJ; Construction: Flat; Length: 3.2mm; Width: 1.6mm; Height: 1.6mm; Height - Seated (Max): 0.071inch; Depth: 1.6mm; Radiation Hardening: No; REACH SVHC: No SVHC; Lead Free: Lead Free; RoHS Compliant: Yes; ComponentLink1URL: https://datasheet.ciiva.com/11793/0900766b80ccdc61-11793223.pdf?src-supplier=RSComponents; ComponentLink1Description: https://datasheet.ciiva.com/11793/0900766b80ccdc61-11793223.pdf?src-supplier=RSComponents; ComponentLink2URL: https://datasheet.ciiva.com/263/taj-263371.pdf?src-supplier=Digi-Key; ComponentLink2Description: https://datasheet.ciiva.com/263/taj-263371.pdf?src-supplier=Digi-Key; ComponentLink3URL: https://datasheet.ciiva.com/263/taj-263370.pdf?src-supplier=Digi-Key; ComponentLink3Description: https://datasheet.ciiva.com/263/taj-263370.pdf?src-supplier=Digi-Key; ComponentLink4URL: https://datasheet.ciiva.com/263/taj-263372.pdf?src-supplier=Digi-Key; ComponentLink4Description: https://datasheet.ciiva.com/263/taj-263372.pdf?src-supplier=Digi-Key; ComponentLink5URL: https://datasheet.ciiva.com/12882/taj-27497-12882838.pdf?src-supplier=Mouser; ComponentLink5Description: https://datasheet.ciiva.com/12882/taj-27497-12882838.pdf?src-supplier=Mouser; ComponentLink6URL: https://datasheet.ciiva.com/14590/70001050-14590668.pdf?src-supplier=Allied+Electronics; ComponentLink6Description: https://datasheet.ciiva.com/14590/70001050-14590668.pdf?src-supplier=Allied+Electronics; ComponentLink7URL: https://datasheet.ciiva.com/3004/taj-3004383.pdf?src-supplier=Avnet; ComponentLink7Description: https://datasheet.ciiva.com/3004/taj-3004383.pdf?src-supplier=Avnet; ComponentLink8URL: https://datasheet.ciiva.com/16201/taj-16201592.pdf?src-supplier=Future+Electronics; ComponentLink8Description: https://datasheet.ciiva.com/16201/taj-16201592.pdf?src-supplier=Future+Electronics; ComponentLink9URL: https://datasheet.ciiva.com/16486/taj-16486089.pdf?src-supplier=Avnet+Asia; ComponentLink9Description: https://datasheet.ciiva.com/16486/taj-16486089.pdf?src-supplier=Avnet+Asia; ComponentLink10URL: https://datasheet.ciiva.com/3004/taj-3004384.pdf?src-supplier=Avnet; ComponentLink10Description: https://datasheet.ciiva.com/3004/taj-3004384.pdf?src-supplier=Avnet
footprint Capacitor/Tantalum  - SMD3216/A - AVX (1206/3216-18 SIZE A-AVX)
pins: 1, 2
text: +

## TAJA106K010RNJ
designator C?  Supplier Part Number 1: 1354011
钽电容 10uF ±10% 10V 3Ω A型3216; Manufacturer: Kyocera AVX; Manufacturer Part Number: TAJA106K010RNJ; Dielectric Material: Tantalum; ESR (Equivalent Series Resistance): 3R; Leakage Current: 1uA; Polarity: Polar; Dissipation Factor: 6%; Q Factor: 6; Supplier 1: RSComponents; RoHS: Yes; Category: Tantalum Capacitors; Stock 1: 22000; Pricing 1: 2000=0.18200, 4000=0.17500, 6000=0.16700 (USD); Mount: Surface Mount,PCB; Case/Package: 1206; Number of Pins: 2; Case Code (Metric): 3216; Case Code (Imperial): 1206; Min Operating Temperature: -55°C; Max Operating Temperature: 125°C; Capacitance: 10uF; Tolerance: 10%; Voltage Rating (DC): 10V; Packaging: Tape and Reel; Voltage Rating: 10V; Package Quantity: 1; Termination: SMD/SMT; Voltage: 10V; Features: General Purpose; Series: TAJ; Construction: Flat; Length: 3.2mm; Width: 1.6mm; Height: 1.6mm; Height - Seated (Max): 0.071inch; Depth: 1.6mm; Radiation Hardening: No; Lead Free: Lead Free; RoHS Compliant: Yes; REACH SVHC: No SVHC; ComponentLink1URL: https://datasheet.ciiva.com/11793/0900766b80ccdc61-11793042.pdf?src-supplier=RSComponents; ComponentLink1Description: https://datasheet.ciiva.com/11793/0900766b80ccdc61-11793042.pdf?src-supplier=RSComponents; ComponentLink2URL: https://datasheet.ciiva.com/26341/559409-da-01-en-tacc-a-3-2-mm-x-1-6-mm-x-1-6-mm-10-uf-26341749.pdf?src-supplier=Conrad; ComponentLink2Description: https://datasheet.ciiva.com/26341/559409-da-01-en-tacc-a-3-2-mm-x-1-6-mm-x-1-6-mm-10-uf-26341749.pdf?src-supplier=Conrad; ComponentLink3URL: https://datasheet.ciiva.com/26787/taja106k010rnj-26787085.pdf?src-supplier=IIIC; ComponentLink3Description: https://datasheet.ciiva.com/26787/taja106k010rnj-26787085.pdf?src-supplier=IIIC; ComponentLink4URL: https://datasheet.ciiva.com/18710/taj-eng-18710645.pdf?src-supplier=Distrelec; ComponentLink4Description: https://datasheet.ciiva.com/18710/taj-eng-18710645.pdf?src-supplier=Distrelec; ComponentLink5URL: https://datasheet.ciiva.com/7730/1703059-7730710.pdf?src-supplier=Element14; ComponentLink5Description: https://datasheet.ciiva.com/7730/1703059-7730710.pdf?src-supplier=Element14; ComponentLink6URL: https://datasheet.ciiva.com/7730/1826076-7730711.pdf?src-supplier=Element14; ComponentLink6Description: https://datasheet.ciiva.com/7730/1826076-7730711.pdf?src-supplier=Element14; ComponentLink7URL: https://datasheet.ciiva.com/5936/2613-5936824.pdf?src-supplier=Farnell; ComponentLink7Description: https://datasheet.ciiva.com/5936/2613-5936824.pdf?src-supplier=Farnell; ComponentLink8URL: https://datasheet.ciiva.com/7730/1826076-7730709.pdf?src-supplier=Element14; ComponentLink8Description: https://datasheet.ciiva.com/7730/1826076-7730709.pdf?src-supplier=Element14; ComponentLink9URL: https://datasheet.ciiva.com/263/taj-263395.pdf?src-supplier=Digi-Key; ComponentLink9Description: https://datasheet.ciiva.com/263/taj-263395.pdf?src-supplier=Digi-Key; ComponentLink10URL: https://datasheet.ciiva.com/263/taj-263394.pdf?src-supplier=Digi-Key; ComponentLink10Description: https://datasheet.ciiva.com/263/taj-263394.pdf?src-supplier=Digi-Key; ComponentLink11URL: https://datasheet.ciiva.com/263/taj-263396.pdf?src-supplier=Digi-Key; ComponentLink11Description: https://datasheet.ciiva.com/263/taj-263396.pdf?src-supplier=Digi-Key; ComponentLink12URL: https://datasheet.ciiva.com/12882/taj-27497-12882583.pdf?src-supplier=Mouser; ComponentLink12Description: https://datasheet.ciiva.com/12882/taj-27497-12882583.pdf?src-supplier=Mouser; ComponentLink13URL: https://datasheet.ciiva.com/14593/70001050-14593951.pdf?src-supplier=Allied+Electronics; ComponentLink13Description: https://datasheet.ciiva.com/14593/70001050-14593951.pdf?src-supplier=Allied+Electronics; ComponentLink14URL: https://datasheet.ciiva.com/3004/taj-3004385.pdf?src-supplier=Avnet; ComponentLink14Description: https://datasheet.ciiva.com/3004/taj-3004385.pdf?src-supplier=Avnet; ComponentLink15URL: https://datasheet.ciiva.com/16486/taj-16486093.pdf?src-supplier=Avnet+Asia; ComponentLink15Description: https://datasheet.ciiva.com/16486/taj-16486093.pdf?src-supplier=Avnet+Asia; ComponentLink16URL: https://datasheet.ciiva.com/3004/taj-3004386.pdf?src-supplier=Avnet; ComponentLink16Description: https://datasheet.ciiva.com/3004/taj-3004386.pdf?src-supplier=Avnet
footprint Capacitor/Tantalum  - SMD3216/A - AVX (1206/3216-18 SIZE A-AVX)
pins: 1, 2
text: +

## TAJA106K016RNJ
designator C?  Supplier Part Number 1: 60R5827
Cap Tant Solid 10uF 16V A CASE 10%( 3.2 X 1.6 X 1.6mm) Inward L SMD 3216-18 3 Ohm 125C T/R; Manufacturer: Kyocera AVX; Manufacturer Part Number: TAJA106K016RNJ; Dielectric Material: Tantalum; ESR (Equivalent Series Resistance): 3R; Leakage Current: 1.6uA; Dissipation Factor: 8%; Polarity: Polar; Supplier 1: Newark; RoHS: Yes; Category: Tantalum Capacitors; Mount: Surface Mount,PCB; Case/Package: 1206; Number of Pins: 2; Case Code (Metric): 3216; Case Code (Imperial): 1206; Min Operating Temperature: -55°C; Max Operating Temperature: 125°C; Capacitance: 10uF; Tolerance: 10%; Packaging: Tape and Reel; Voltage Rating (DC): 16V; Package Quantity: 1; Voltage Rating: 16V; Termination: SMD/SMT; Voltage: 16V; Features: General Purpose; Length: 3.2mm; Width: 1.6mm; Height: 1.6mm; Depth: 1.6mm; Height - Seated (Max): 0.071inch; Lead Pitch: 1.1mm; Radiation Hardening: No; Lead Free: Lead Free; RoHS Compliant: Yes; REACH SVHC: No SVHC; ComponentLink1URL: https://datasheet.ciiva.com/27051/1234933-27051768.pdf?src-supplier=Jameco; ComponentLink1Description: https://datasheet.ciiva.com/27051/1234933-27051768.pdf?src-supplier=Jameco; ComponentLink2URL: https://datasheet.ciiva.com/26341/559411-da-01-en-tacc-a-3-2-mm-x-1-6-mm-x-1-6-mm-10-uf-26341755.pdf?src-supplier=Conrad; ComponentLink2Description: https://datasheet.ciiva.com/26341/559411-da-01-en-tacc-a-3-2-mm-x-1-6-mm-x-1-6-mm-10-uf-26341755.pdf?src-supplier=Conrad; ComponentLink3URL: https://datasheet.ciiva.com/18710/taj-eng-18710622.pdf?src-supplier=Distrelec; ComponentLink3Description: https://datasheet.ciiva.com/18710/taj-eng-18710622.pdf?src-supplier=Distrelec; ComponentLink4URL: https://datasheet.ciiva.com/7730/1703059-7730712.pdf?src-supplier=Element14; ComponentLink4Description: https://datasheet.ciiva.com/7730/1703059-7730712.pdf?src-supplier=Element14; ComponentLink5URL: https://datasheet.ciiva.com/7730/1703059-7730713.pdf?src-supplier=Element14; ComponentLink5Description: https://datasheet.ciiva.com/7730/1703059-7730713.pdf?src-supplier=Element14; ComponentLink6URL: https://datasheet.ciiva.com/7730/taj-7730975.pdf?src-supplier=Element14; ComponentLink6Description: https://datasheet.ciiva.com/7730/taj-7730975.pdf?src-supplier=Element14; ComponentLink7URL: https://datasheet.ciiva.com/7730/1680476-7730714.pdf?src-supplier=Element14; ComponentLink7Description: https://datasheet.ciiva.com/7730/1680476-7730714.pdf?src-supplier=Element14; ComponentLink8URL: https://datasheet.ciiva.com/263/taj-263392.pdf?src-supplier=Digi-Key; ComponentLink8Description: https://datasheet.ciiva.com/263/taj-263392.pdf?src-supplier=Digi-Key; ComponentLink9URL: https://datasheet.ciiva.com/263/taj-263391.pdf?src-supplier=Digi-Key; ComponentLink9Description: https://datasheet.ciiva.com/263/taj-263391.pdf?src-supplier=Digi-Key; ComponentLink10URL: https://datasheet.ciiva.com/263/taj-263393.pdf?src-supplier=Digi-Key; ComponentLink10Description: https://datasheet.ciiva.com/263/taj-263393.pdf?src-supplier=Digi-Key; ComponentLink11URL: https://datasheet.ciiva.com/12882/taj-27497-12882509.pdf?src-supplier=Mouser; ComponentLink11Description: https://datasheet.ciiva.com/12882/taj-27497-12882509.pdf?src-supplier=Mouser; ComponentLink12URL: https://datasheet.ciiva.com/3004/taj-3004388.pdf?src-supplier=Avnet; ComponentLink12Description: https://datasheet.ciiva.com/3004/taj-3004388.pdf?src-supplier=Avnet; ComponentLink13URL: https://datasheet.ciiva.com/16379/taj-16379015.pdf?src-supplier=Future+Electronics; ComponentLink13Description: https://datasheet.ciiva.com/16379/taj-16379015.pdf?src-supplier=Future+Electronics; ComponentLink14URL: https://datasheet.ciiva.com/3004/taj-3004387.pdf?src-supplier=Avnet; ComponentLink14Description: https://datasheet.ciiva.com/3004/taj-3004387.pdf?src-supplier=Avnet
footprint Capacitor/Tantalum  - SMD3216/A - AVX (1206/3216-18 SIZE A-AVX)
pins: 1, 2
text: +

## TAJA107K002RNJ
designator C?  Supplier Part Number 1: 581-TAJA107K002RNJ
AVX - TAJA107K002RNJ - CAP, TANT, 100UF, 2.5V, CASE A; Manufacturer: Kyocera AVX; Dielectric Material: Tantalum; Tolerance: 10%; ESR (Equivalent Series Resistance): 1.4R; Leakage Current: 2.5uA; Polarity: Polar; Dissipation Factor: 30%; Supplier 1: Mouser; Manufacturer Part Number: TAJA107K002RNJ; RoHS: Yes; Category: Tantalum Capacitors; Stock 1: 417; Pricing 1: 1=1.17000, 10=0.86600, 50=0.86600, 100=0.69300, 1000=0.48800, 10000=0.48800 (USD); Mount: Surface Mount; Case/Package: 1206; Case Code (Imperial): 1206; Case Code (Metric): 3216; Weight: 0.000571oz; Min Operating Temperature: -55°C; Max Operating Temperature: 125°C; Capacitance: 100uF; Packaging: Tape and Reel; Voltage Rating: 2.5V; Package Quantity: 2000; Termination: SMD/SMT; Voltage Rating (DC): 2.5V; Features: General Purpose; Series: TAJ; Construction: Flat; Length: 3.2mm; Width: 1.6mm; Height: 1.8mm; Height - Seated (Max): 0.071inch; Depth: 1.6mm; Radiation Hardening: No; REACH SVHC: No SVHC; Lead Free: Lead Free; RoHS Compliant: Yes; ComponentLink1URL: https://datasheet.ciiva.com/7720/84652-7720597.pdf?src-supplier=Element14; ComponentLink1Description: https://datasheet.ciiva.com/7720/84652-7720597.pdf?src-supplier=Element14; ComponentLink2URL: https://datasheet.ciiva.com/12886/taj-27497-12886583.pdf?src-supplier=Mouser; ComponentLink2Description: https://datasheet.ciiva.com/12886/taj-27497-12886583.pdf?src-supplier=Mouser; ComponentLink3URL: https://datasheet.ciiva.com/11226/taj-11226095.pdf?src-supplier=Avnet; ComponentLink3Description: https://datasheet.ciiva.com/11226/taj-11226095.pdf?src-supplier=Avnet; ComponentLink4URL: https://datasheet.ciiva.com/6238/taj-6238634.pdf?src-supplier=Digi-Key; ComponentLink4Description: https://datasheet.ciiva.com/6238/taj-6238634.pdf?src-supplier=Digi-Key
footprint Capacitor/Tantalum  - SMD3216/A - AVX (1206/3216-18 SIZE A-AVX)
pins: 1, 2
text: +
